# Altium footprint library LHAC-4XDSP2XV7-VP5_0226_3.PcbLib: 96 footprints (part 8 of 12)
Each footprint in its own frame and in the unit in brackets; x right, y up, seen from the top. Pads: shape width x height; smd on the part's side, far side on the other; paste and mask are expansions set on the pad; w line width, h text height; cw(c..) or ccw(c..) is an arc to the next point about the centre after c.
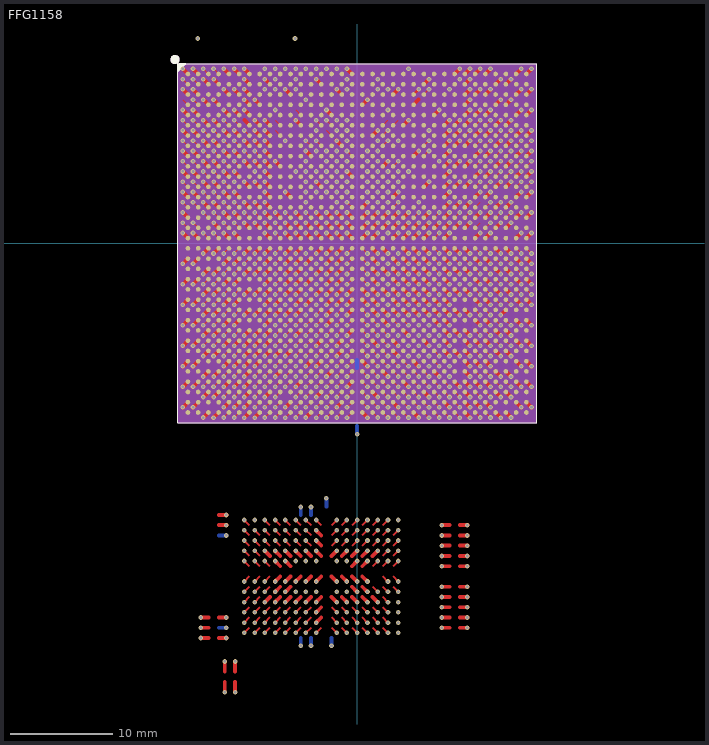
[diagram p7: the footprint, top view; thin cyan lines are the x and y axes]

## FFG1158 [mil] "FFG1158"
pads (1156):
  round 17.72 smd: A1(-649.6,649.6) A2(-610.2,649.6) A3(-570.9,649.6) A4(-531.5,649.6) A5(-492.1,649.6) A6(-452.8,649.6) A7(-413.4,649.6) A8(-374,649.6) A9(-334.6,649.6) A10(-295.3,649.6) A11(-255.9,649.6) A12(-216.5,649.6) A13(-177.2,649.6) A14(-137.8,649.6) A15(-98.4,649.6) A16(-59.1,649.6) A17(-19.7,649.6) A18(19.7,649.6) A19(59.1,649.6) A20(98.4,649.6) A21(137.8,649.6) A22(177.2,649.6) A23(216.5,649.6) A24(255.9,649.6) A25(295.3,649.6) A26(334.6,649.6) A27(374,649.6) A28(413.4,649.6) A29(452.8,649.6) A30(492.1,649.6) A31(531.5,649.6) A32(570.9,649.6) A33(610.2,649.6) A34(649.6,649.6) AA1(-649.6,-137.8) AA2(-610.2,-137.8) AA3(-570.9,-137.8) AA4(-531.5,-137.8) AA5(-492.1,-137.8) AA6(-452.8,-137.8) AA7(-413.4,-137.8) AA8(-374,-137.8) AA9(-334.6,-137.8) AA10(-295.3,-137.8) AA11(-255.9,-137.8) AA12(-216.5,-137.8) AA13(-177.2,-137.8) AA14(-137.8,-137.8) AA15(-98.4,-137.8) AA16(-59.1,-137.8) AA17(-19.7,-137.8) AA18(19.7,-137.8) AA19(59.1,-137.8) AA20(98.4,-137.8) AA21(137.8,-137.8) AA22(177.2,-137.8) AA23(216.5,-137.8) AA24(255.9,-137.8) AA25(295.3,-137.8) AA26(334.6,-137.8) AA27(374,-137.8) AA28(413.4,-137.8) AA29(452.8,-137.8) AA30(492.1,-137.8) AA31(531.5,-137.8) AA32(570.9,-137.8) AA33(610.2,-137.8) AA34(649.6,-137.8) AB1(-649.6,-177.2) AB2(-610.2,-177.2) AB3(-570.9,-177.2) AB4(-531.5,-177.2) AB5(-492.1,-177.2) AB6(-452.8,-177.2) AB7(-413.4,-177.2) AB8(-374,-177.2) AB9(-334.6,-177.2) AB10(-295.3,-177.2) AB11(-255.9,-177.2) AB12(-216.5,-177.2) AB13(-177.2,-177.2) AB14(-137.8,-177.2) AB15(-98.4,-177.2) AB16(-59.1,-177.2) AB17(-19.7,-177.2) AB18(19.7,-177.2) AB19(59.1,-177.2) AB20(98.4,-177.2) AB21(137.8,-177.2) AB22(177.2,-177.2) AB23(216.5,-177.2) AB24(255.9,-177.2) AB25(295.3,-177.2) AB26(334.6,-177.2) AB27(374,-177.2) AB28(413.4,-177.2) AB29(452.8,-177.2) AB30(492.1,-177.2) AB31(531.5,-177.2) AB32(570.9,-177.2) AB33(610.2,-177.2) AB34(649.6,-177.2) AC1(-649.6,-216.5) AC2(-610.2,-216.5) AC3(-570.9,-216.5) AC4(-531.5,-216.5) AC5(-492.1,-216.5) AC6(-452.8,-216.5) AC7(-413.4,-216.5) AC8(-374,-216.5) AC9(-334.6,-216.5) AC10(-295.3,-216.5) AC11(-255.9,-216.5) AC12(-216.5,-216.5) AC13(-177.2,-216.5) AC14(-137.8,-216.5) AC15(-98.4,-216.5) AC16(-59.1,-216.5) AC17(-19.7,-216.5) AC18(19.7,-216.5) AC19(59.1,-216.5) AC20(98.4,-216.5) AC21(137.8,-216.5) AC22(177.2,-216.5) AC23(216.5,-216.5) AC24(255.9,-216.5) AC25(295.3,-216.5) AC26(334.6,-216.5) AC27(374,-216.5) AC28(413.4,-216.5) AC29(452.8,-216.5) AC30(492.1,-216.5) AC31(531.5,-216.5) AC32(570.9,-216.5) AC33(610.2,-216.5) AC34(649.6,-216.5) AD1(-649.6,-255.9) AD2(-610.2,-255.9) AD3(-570.9,-255.9) AD4(-531.5,-255.9) AD5(-492.1,-255.9) AD6(-452.8,-255.9) AD7(-413.4,-255.9) AD8(-374,-255.9) AD9(-334.6,-255.9) AD10(-295.3,-255.9) AD11(-255.9,-255.9) AD12(-216.5,-255.9) AD13(-177.2,-255.9) AD14(-137.8,-255.9) AD15(-98.4,-255.9) AD16(-59.1,-255.9) AD17(-19.7,-255.9) AD18(19.7,-255.9) AD19(59.1,-255.9) AD20(98.4,-255.9) AD21(137.8,-255.9) AD22(177.2,-255.9) AD23(216.5,-255.9) AD24(255.9,-255.9) AD25(295.3,-255.9) AD26(334.6,-255.9) AD27(374,-255.9) AD28(413.4,-255.9) AD29(452.8,-255.9) AD30(492.1,-255.9) AD31(531.5,-255.9) AD32(570.9,-255.9) AD33(610.2,-255.9) AD34(649.6,-255.9) AE1(-649.6,-295.3) AE2(-610.2,-295.3) AE3(-570.9,-295.3) AE4(-531.5,-295.3) AE5(-492.1,-295.3) AE6(-452.8,-295.3) AE7(-413.4,-295.3) AE8(-374,-295.3) AE9(-334.6,-295.3) AE10(-295.3,-295.3) AE11(-255.9,-295.3) AE12(-216.5,-295.3) AE13(-177.2,-295.3) AE14(-137.8,-295.3) AE15(-98.4,-295.3) AE16(-59.1,-295.3) AE17(-19.7,-295.3) AE18(19.7,-295.3) AE19(59.1,-295.3) AE20(98.4,-295.3) AE21(137.8,-295.3) AE22(177.2,-295.3) AE23(216.5,-295.3) AE24(255.9,-295.3) AE25(295.3,-295.3) AE26(334.6,-295.3) AE27(374,-295.3) AE28(413.4,-295.3) AE29(452.8,-295.3) AE30(492.1,-295.3) AE31(531.5,-295.3) AE32(570.9,-295.3) AE33(610.2,-295.3) AE34(649.6,-295.3) AF1(-649.6,-334.6) AF2(-610.2,-334.6) AF3(-570.9,-334.6) AF4(-531.5,-334.6) AF5(-492.1,-334.6) AF6(-452.8,-334.6) AF7(-413.4,-334.6) AF8(-374,-334.6) AF9(-334.6,-334.6) AF10(-295.3,-334.6) AF11(-255.9,-334.6) AF12(-216.5,-334.6) AF13(-177.2,-334.6) AF14(-137.8,-334.6) AF15(-98.4,-334.6) AF16(-59.1,-334.6) AF17(-19.7,-334.6) AF18(19.7,-334.6) AF19(59.1,-334.6) AF20(98.4,-334.6) AF21(137.8,-334.6) AF22(177.2,-334.6) AF23(216.5,-334.6) AF24(255.9,-334.6) AF25(295.3,-334.6) AF26(334.6,-334.6) AF27(374,-334.6) AF28(413.4,-334.6) AF29(452.8,-334.6) AF30(492.1,-334.6) AF31(531.5,-334.6) AF32(570.9,-334.6) AF33(610.2,-334.6) AF34(649.6,-334.6) AG1(-649.6,-374) AG2(-610.2,-374) AG3(-570.9,-374) AG4(-531.5,-374) AG5(-492.1,-374) AG6(-452.8,-374) AG7(-413.4,-374) AG8(-374,-374) AG9(-334.6,-374) AG10(-295.3,-374) AG11(-255.9,-374) AG12(-216.5,-374) AG13(-177.2,-374) AG14(-137.8,-374) AG15(-98.4,-374) AG16(-59.1,-374) AG17(-19.7,-374) AG18(19.7,-374) AG19(59.1,-374) AG20(98.4,-374) AG21(137.8,-374) AG22(177.2,-374) AG23(216.5,-374) AG24(255.9,-374) AG25(295.3,-374) AG26(334.6,-374) AG27(374,-374) AG28(413.4,-374) AG29(452.8,-374) AG30(492.1,-374) AG31(531.5,-374) AG32(570.9,-374) AG33(610.2,-374) AG34(649.6,-374) AH1(-649.6,-413.4) AH2(-610.2,-413.4) AH3(-570.9,-413.4) AH4(-531.5,-413.4) AH5(-492.1,-413.4) AH6(-452.8,-413.4) AH7(-413.4,-413.4) AH8(-374,-413.4) AH9(-334.6,-413.4) AH10(-295.3,-413.4) AH11(-255.9,-413.4) AH12(-216.5,-413.4) AH13(-177.2,-413.4) AH14(-137.8,-413.4) AH15(-98.4,-413.4) AH16(-59.1,-413.4) AH17(-19.7,-413.4) AH18(19.7,-413.4) AH19(59.1,-413.4) AH20(98.4,-413.4) AH21(137.8,-413.4) AH22(177.2,-413.4) AH23(216.5,-413.4) AH24(255.9,-413.4) AH25(295.3,-413.4) AH26(334.6,-413.4) AH27(374,-413.4) AH28(413.4,-413.4) AH29(452.8,-413.4) AH30(492.1,-413.4) AH31(531.5,-413.4) AH32(570.9,-413.4) AH33(610.2,-413.4) AH34(649.6,-413.4) AJ1(-649.6,-452.8) AJ2(-610.2,-452.8) AJ3(-570.9,-452.8) AJ4(-531.5,-452.8) AJ5(-492.1,-452.8) AJ6(-452.8,-452.8) AJ7(-413.4,-452.8) AJ8(-374,-452.8) AJ9(-334.6,-452.8) AJ10(-295.3,-452.8) AJ11(-255.9,-452.8) AJ12(-216.5,-452.8) AJ13(-177.2,-452.8) AJ14(-137.8,-452.8) AJ15(-98.4,-452.8) AJ16(-59.1,-452.8) AJ17(-19.7,-452.8) AJ18(19.7,-452.8) AJ19(59.1,-452.8) AJ20(98.4,-452.8) AJ21(137.8,-452.8) AJ22(177.2,-452.8) AJ23(216.5,-452.8) AJ24(255.9,-452.8) AJ25(295.3,-452.8) AJ26(334.6,-452.8) AJ27(374,-452.8) AJ28(413.4,-452.8) AJ29(452.8,-452.8) AJ30(492.1,-452.8) AJ31(531.5,-452.8) AJ32(570.9,-452.8) AJ33(610.2,-452.8) AJ34(649.6,-452.8) AK1(-649.6,-492.1) AK2(-610.2,-492.1) AK3(-570.9,-492.1) AK4(-531.5,-492.1) AK5(-492.1,-492.1) AK6(-452.8,-492.1) AK7(-413.4,-492.1) AK8(-374,-492.1) AK9(-334.6,-492.1) AK10(-295.3,-492.1) AK11(-255.9,-492.1) AK12(-216.5,-492.1) AK13(-177.2,-492.1) AK14(-137.8,-492.1) AK15(-98.4,-492.1) AK16(-59.1,-492.1) AK17(-19.7,-492.1) AK18(19.7,-492.1) AK19(59.1,-492.1) AK20(98.4,-492.1) AK21(137.8,-492.1) AK22(177.2,-492.1) AK23(216.5,-492.1) AK24(255.9,-492.1) AK25(295.3,-492.1) AK26(334.6,-492.1) AK27(374,-492.1) AK28(413.4,-492.1) AK29(452.8,-492.1) AK30(492.1,-492.1) AK31(531.5,-492.1) AK32(570.9,-492.1) AK33(610.2,-492.1) AK34(649.6,-492.1) AL1(-649.6,-531.5) AL2(-610.2,-531.5) AL3(-570.9,-531.5) AL4(-531.5,-531.5) AL5(-492.1,-531.5) AL6(-452.8,-531.5) AL7(-413.4,-531.5) AL8(-374,-531.5) AL9(-334.6,-531.5) AL10(-295.3,-531.5) AL11(-255.9,-531.5) AL12(-216.5,-531.5) AL13(-177.2,-531.5) AL14(-137.8,-531.5) AL15(-98.4,-531.5) AL16(-59.1,-531.5) AL17(-19.7,-531.5) AL18(19.7,-531.5) AL19(59.1,-531.5) AL20(98.4,-531.5) AL21(137.8,-531.5) AL22(177.2,-531.5) AL23(216.5,-531.5) AL24(255.9,-531.5) AL25(295.3,-531.5) AL26(334.6,-531.5) AL27(374,-531.5) AL28(413.4,-531.5) AL29(452.8,-531.5) AL30(492.1,-531.5) AL31(531.5,-531.5) AL32(570.9,-531.5) AL33(610.2,-531.5) AL34(649.6,-531.5) AM1(-649.6,-570.9) AM2(-610.2,-570.9) AM3(-570.9,-570.9) AM4(-531.5,-570.9) AM5(-492.1,-570.9) AM6(-452.8,-570.9) AM7(-413.4,-570.9) AM8(-374,-570.9) AM9(-334.6,-570.9) AM10(-295.3,-570.9) AM11(-255.9,-570.9) AM12(-216.5,-570.9) AM13(-177.2,-570.9) AM14(-137.8,-570.9) AM15(-98.4,-570.9) AM16(-59.1,-570.9) AM17(-19.7,-570.9) AM18(19.7,-570.9) AM19(59.1,-570.9) AM20(98.4,-570.9) AM21(137.8,-570.9) AM22(177.2,-570.9) AM23(216.5,-570.9) AM24(255.9,-570.9) AM25(295.3,-570.9) AM26(334.6,-570.9) AM27(374,-570.9) AM28(413.4,-570.9) AM29(452.8,-570.9) AM30(492.1,-570.9) AM31(531.5,-570.9) AM32(570.9,-570.9) AM33(610.2,-570.9) AM34(649.6,-570.9) AN1(-649.6,-610.2) AN2(-610.2,-610.2) AN3(-570.9,-610.2) AN4(-531.5,-610.2) AN5(-492.1,-610.2) AN6(-452.8,-610.2) AN7(-413.4,-610.2) AN8(-374,-610.2) AN9(-334.6,-610.2) AN10(-295.3,-610.2) AN11(-255.9,-610.2) AN12(-216.5,-610.2) AN13(-177.2,-610.2) AN14(-137.8,-610.2) AN15(-98.4,-610.2) AN16(-59.1,-610.2) AN17(-19.7,-610.2) AN18(19.7,-610.2) AN19(59.1,-610.2) AN20(98.4,-610.2) AN21(137.8,-610.2) AN22(177.2,-610.2) AN23(216.5,-610.2) AN24(255.9,-610.2) AN25(295.3,-610.2) AN26(334.6,-610.2) AN27(374,-610.2) AN28(413.4,-610.2) AN29(452.8,-610.2) AN30(492.1,-610.2) AN31(531.5,-610.2) AN32(570.9,-610.2) AN33(610.2,-610.2) AN34(649.6,-610.2) AP1(-649.6,-649.6) AP2(-610.2,-649.6) AP3(-570.9,-649.6) AP4(-531.5,-649.6) AP5(-492.1,-649.6) AP6(-452.8,-649.6) AP7(-413.4,-649.6) AP8(-374,-649.6) AP9(-334.6,-649.6) AP10(-295.3,-649.6) AP11(-255.9,-649.6) AP12(-216.5,-649.6) AP13(-177.2,-649.6) AP14(-137.8,-649.6) AP15(-98.4,-649.6) AP16(-59.1,-649.6) AP17(-19.7,-649.6) AP18(19.7,-649.6) AP19(59.1,-649.6) AP20(98.4,-649.6) AP21(137.8,-649.6) AP22(177.2,-649.6) AP23(216.5,-649.6) AP24(255.9,-649.6) AP25(295.3,-649.6) AP26(334.6,-649.6) AP27(374,-649.6) AP28(413.4,-649.6) AP29(452.8,-649.6) AP30(492.1,-649.6) AP31(531.5,-649.6) AP32(570.9,-649.6) AP33(610.2,-649.6) AP34(649.6,-649.6) B1(-649.6,610.2) B2(-610.2,610.2) B3(-570.9,610.2) B4(-531.5,610.2) B5(-492.1,610.2) B6(-452.8,610.2) B7(-413.4,610.2) B8(-374,610.2) B9(-334.6,610.2) B10(-295.3,610.2) B11(-255.9,610.2) B12(-216.5,610.2) B13(-177.2,610.2) B14(-137.8,610.2) B15(-98.4,610.2) B16(-59.1,610.2) B17(-19.7,610.2) B18(19.7,610.2) B19(59.1,610.2) B20(98.4,610.2) B21(137.8,610.2) B22(177.2,610.2) B23(216.5,610.2) B24(255.9,610.2) B25(295.3,610.2) B26(334.6,610.2) B27(374,610.2) B28(413.4,610.2) B29(452.8,610.2) B30(492.1,610.2) B31(531.5,610.2) B32(570.9,610.2) B33(610.2,610.2) B34(649.6,610.2) C1(-649.6,570.9) C2(-610.2,570.9) C3(-570.9,570.9) C4(-531.5,570.9) C5(-492.1,570.9) C6(-452.8,570.9) C7(-413.4,570.9) C8(-374,570.9) C9(-334.6,570.9) C10(-295.3,570.9) C11(-255.9,570.9) C12(-216.5,570.9) C13(-177.2,570.9) C14(-137.8,570.9) C15(-98.4,570.9) C16(-59.1,570.9) C17(-19.7,570.9) C18(19.7,570.9) C19(59.1,570.9) C20(98.4,570.9) C21(137.8,570.9) C22(177.2,570.9) C23(216.5,570.9) C24(255.9,570.9) C25(295.3,570.9) C26(334.6,570.9) C27(374,570.9) C28(413.4,570.9) C29(452.8,570.9) C30(492.1,570.9) C31(531.5,570.9) C32(570.9,570.9) C33(610.2,570.9) C34(649.6,570.9) D1(-649.6,531.5) D2(-610.2,531.5) D3(-570.9,531.5) D4(-531.5,531.5) D5(-492.1,531.5) D6(-452.8,531.5) D7(-413.4,531.5) D8(-374,531.5) D9(-334.6,531.5) D10(-295.3,531.5) D11(-255.9,531.5) D12(-216.5,531.5) D13(-177.2,531.5) D14(-137.8,531.5) D15(-98.4,531.5) D16(-59.1,531.5) D17(-19.7,531.5) D18(19.7,531.5) D19(59.1,531.5) D20(98.4,531.5) D21(137.8,531.5) D22(177.2,531.5) D23(216.5,531.5) D24(255.9,531.5) D25(295.3,531.5) D26(334.6,531.5) D27(374,531.5) D28(413.4,531.5) D29(452.8,531.5) D30(492.1,531.5) D31(531.5,531.5) D32(570.9,531.5) D33(610.2,531.5) D34(649.6,531.5) E1(-649.6,492.1) E2(-610.2,492.1) E3(-570.9,492.1) E4(-531.5,492.1) E5(-492.1,492.1) E6(-452.8,492.1) E7(-413.4,492.1) E8(-374,492.1) E9(-334.6,492.1) E10(-295.3,492.1) E11(-255.9,492.1) E12(-216.5,492.1) E13(-177.2,492.1) E14(-137.8,492.1) E15(-98.4,492.1) E16(-59.1,492.1) E17(-19.7,492.1) E18(19.7,492.1) E19(59.1,492.1) E20(98.4,492.1) E21(137.8,492.1) E22(177.2,492.1) E23(216.5,492.1) E24(255.9,492.1) E25(295.3,492.1) E26(334.6,492.1) E27(374,492.1) E28(413.4,492.1) E29(452.8,492.1) E30(492.1,492.1) E31(531.5,492.1) E32(570.9,492.1) E33(610.2,492.1) E34(649.6,492.1) F1(-649.6,452.8) F2(-610.2,452.8) F3(-570.9,452.8) F4(-531.5,452.8) F5(-492.1,452.8) F6(-452.8,452.8) F7(-413.4,452.8) F8(-374,452.8) F9(-334.6,452.8) F10(-295.3,452.8) F11(-255.9,452.8) F12(-216.5,452.8) F13(-177.2,452.8) F14(-137.8,452.8) F15(-98.4,452.8) F16(-59.1,452.8) F17(-19.7,452.8) F18(19.7,452.8) F19(59.1,452.8) F20(98.4,452.8) F21(137.8,452.8) F22(177.2,452.8) F23(216.5,452.8) F24(255.9,452.8) F25(295.3,452.8) F26(334.6,452.8) F27(374,452.8) F28(413.4,452.8) F29(452.8,452.8) F30(492.1,452.8) F31(531.5,452.8) F32(570.9,452.8) F33(610.2,452.8) F34(649.6,452.8) G1(-649.6,413.4) G2(-610.2,413.4) G3(-570.9,413.4) G4(-531.5,413.4) G5(-492.1,413.4) G6(-452.8,413.4) G7(-413.4,413.4) G8(-374,413.4) G9(-334.6,413.4) G10(-295.3,413.4) G11(-255.9,413.4) G12(-216.5,413.4) G13(-177.2,413.4) G14(-137.8,413.4) G15(-98.4,413.4) G16(-59.1,413.4) G17(-19.7,413.4) G18(19.7,413.4) G19(59.1,413.4) G20(98.4,413.4) G21(137.8,413.4) G22(177.2,413.4) G23(216.5,413.4) G24(255.9,413.4) G25(295.3,413.4) G26(334.6,413.4) G27(374,413.4) G28(413.4,413.4) G29(452.8,413.4) G30(492.1,413.4) G31(531.5,413.4) G32(570.9,413.4) G33(610.2,413.4) G34(649.6,413.4) H1(-649.6,374) H2(-610.2,374) H3(-570.9,374) H4(-531.5,374) H5(-492.1,374) H6(-452.8,374) H7(-413.4,374) H8(-374,374) H9(-334.6,374) H10(-295.3,374) H11(-255.9,374) H12(-216.5,374) H13(-177.2,374) H14(-137.8,374) H15(-98.4,374) H16(-59.1,374) H17(-19.7,374) H18(19.7,374) H19(59.1,374) H20(98.4,374) H21(137.8,374) H22(177.2,374) H23(216.5,374) H24(255.9,374) H25(295.3,374) H26(334.6,374) H27(374,374) H28(413.4,374) H29(452.8,374) H30(492.1,374) H31(531.5,374) H32(570.9,374) H33(610.2,374) H34(649.6,374) J1(-649.6,334.6) J2(-610.2,334.6) J3(-570.9,334.6) J4(-531.5,334.6) J5(-492.1,334.6) J6(-452.8,334.6) J7(-413.4,334.6) J8(-374,334.6) J9(-334.6,334.6) J10(-295.3,334.6) J11(-255.9,334.6) J12(-216.5,334.6) J13(-177.2,334.6) J14(-137.8,334.6) J15(-98.4,334.6) J16(-59.1,334.6) J17(-19.7,334.6) J18(19.7,334.6) J19(59.1,334.6) J20(98.4,334.6) J21(137.8,334.6) J22(177.2,334.6) J23(216.5,334.6) J24(255.9,334.6) J25(295.3,334.6) J26(334.6,334.6) J27(374,334.6) J28(413.4,334.6) J29(452.8,334.6) J30(492.1,334.6) J31(531.5,334.6) J32(570.9,334.6) J33(610.2,334.6) J34(649.6,334.6) K1(-649.6,295.3) K2(-610.2,295.3) K3(-570.9,295.3) K4(-531.5,295.3) K5(-492.1,295.3) K6(-452.8,295.3) K7(-413.4,295.3) K8(-374,295.3) K9(-334.6,295.3) K10(-295.3,295.3) K11(-255.9,295.3) K12(-216.5,295.3) K13(-177.2,295.3) K14(-137.8,295.3) K15(-98.4,295.3) K16(-59.1,295.3) K17(-19.7,295.3) K18(19.7,295.3) K19(59.1,295.3) K20(98.4,295.3) K21(137.8,295.3) K22(177.2,295.3) K23(216.5,295.3) K24(255.9,295.3) K25(295.3,295.3) K26(334.6,295.3) K27(374,295.3) K28(413.4,295.3) K29(452.8,295.3) K30(492.1,295.3) K31(531.5,295.3) K32(570.9,295.3) K33(610.2,295.3) K34(649.6,295.3) L1(-649.6,255.9) L2(-610.2,255.9) L3(-570.9,255.9) L4(-531.5,255.9) L5(-492.1,255.9) L6(-452.8,255.9) L7(-413.4,255.9) L8(-374,255.9) L9(-334.6,255.9) L10(-295.3,255.9) L11(-255.9,255.9) L12(-216.5,255.9) L13(-177.2,255.9) L14(-137.8,255.9) L15(-98.4,255.9) L16(-59.1,255.9) L17(-19.7,255.9) L18(19.7,255.9) L19(59.1,255.9) L20(98.4,255.9) L21(137.8,255.9) L22(177.2,255.9) L23(216.5,255.9) L24(255.9,255.9) L25(295.3,255.9) L26(334.6,255.9) L27(374,255.9) L28(413.4,255.9) L29(452.8,255.9) L30(492.1,255.9) L31(531.5,255.9) L32(570.9,255.9) L33(610.2,255.9) L34(649.6,255.9) M1(-649.6,216.5) M2(-610.2,216.5) M3(-570.9,216.5) M4(-531.5,216.5) M5(-492.1,216.5) M6(-452.8,216.5) M7(-413.4,216.5) M8(-374,216.5) M9(-334.6,216.5) M10(-295.3,216.5) M11(-255.9,216.5) M12(-216.5,216.5) M13(-177.2,216.5) M14(-137.8,216.5) M15(-98.4,216.5) M16(-59.1,216.5) M17(-19.7,216.5) M18(19.7,216.5) M19(59.1,216.5) M20(98.4,216.5) M21(137.8,216.5) M22(177.2,216.5) M23(216.5,216.5) M24(255.9,216.5) M25(295.3,216.5) M26(334.6,216.5) M27(374,216.5) M28(413.4,216.5) M29(452.8,216.5) M30(492.1,216.5) M31(531.5,216.5) M32(570.9,216.5) M33(610.2,216.5) M34(649.6,216.5) N1(-649.6,177.2) N2(-610.2,177.2) N3(-570.9,177.2) N4(-531.5,177.2) N5(-492.1,177.2) N6(-452.8,177.2) N7(-413.4,177.2) N8(-374,177.2) N9(-334.6,177.2) N10(-295.3,177.2) N11(-255.9,177.2) N12(-216.5,177.2) N13(-177.2,177.2) N14(-137.8,177.2) N15(-98.4,177.2) N16(-59.1,177.2) N17(-19.7,177.2) N18(19.7,177.2) N19(59.1,177.2) N20(98.4,177.2) N21(137.8,177.2) N22(177.2,177.2) N23(216.5,177.2) N24(255.9,177.2) N25(295.3,177.2) N26(334.6,177.2) N27(374,177.2) N28(413.4,177.2) N29(452.8,177.2) N30(492.1,177.2) N31(531.5,177.2) N32(570.9,177.2) N33(610.2,177.2) N34(649.6,177.2) P1(-649.6,137.8) P2(-610.2,137.8) P3(-570.9,137.8) P4(-531.5,137.8) P5(-492.1,137.8) P6(-452.8,137.8) P7(-413.4,137.8) P8(-374,137.8) P9(-334.6,137.8) P10(-295.3,137.8) P11(-255.9,137.8) P12(-216.5,137.8) P13(-177.2,137.8) P14(-137.8,137.8) P15(-98.4,137.8) P16(-59.1,137.8) P17(-19.7,137.8) P18(19.7,137.8) P19(59.1,137.8) P20(98.4,137.8) P21(137.8,137.8) P22(177.2,137.8) P23(216.5,137.8) P24(255.9,137.8) P25(295.3,137.8) P26(334.6,137.8) P27(374,137.8) P28(413.4,137.8) P29(452.8,137.8) P30(492.1,137.8) P31(531.5,137.8) P32(570.9,137.8) P33(610.2,137.8) P34(649.6,137.8) R1(-649.6,98.4) R2(-610.2,98.4) R3(-570.9,98.4) R4(-531.5,98.4) R5(-492.1,98.4) R6(-452.8,98.4) R7(-413.4,98.4) R8(-374,98.4) R9(-334.6,98.4) R10(-295.3,98.4) R11(-255.9,98.4) R12(-216.5,98.4) R13(-177.2,98.4) R14(-137.8,98.4) R15(-98.4,98.4) R16(-59.1,98.4) R17(-19.7,98.4) R18(19.7,98.4) R19(59.1,98.4) R20(98.4,98.4) R21(137.8,98.4) R22(177.2,98.4) R23(216.5,98.4) R24(255.9,98.4) R25(295.3,98.4) R26(334.6,98.4) R27(374,98.4) R28(413.4,98.4) R29(452.8,98.4) R30(492.1,98.4) R31(531.5,98.4) R32(570.9,98.4) R33(610.2,98.4) R34(649.6,98.4) T1(-649.6,59.1) T2(-610.2,59.1) T3(-570.9,59.1) T4(-531.5,59.1) T5(-492.1,59.1) T6(-452.8,59.1) T7(-413.4,59.1) T8(-374,59.1) T9(-334.6,59.1) T10(-295.3,59.1) T11(-255.9,59.1) T12(-216.5,59.1) T13(-177.2,59.1) T14(-137.8,59.1) T15(-98.4,59.1) T16(-59.1,59.1) T17(-19.7,59.1) T18(19.7,59.1) T19(59.1,59.1) T20(98.4,59.1) T21(137.8,59.1) T22(177.2,59.1) T23(216.5,59.1) T24(255.9,59.1) T25(295.3,59.1) T26(334.6,59.1) T27(374,59.1) T28(413.4,59.1) T29(452.8,59.1) T30(492.1,59.1) T31(531.5,59.1) T32(570.9,59.1) T33(610.2,59.1) T34(649.6,59.1) U1(-649.6,19.7) U2(-610.2,19.7) U3(-570.9,19.7) U4(-531.5,19.7) U5(-492.1,19.7) U6(-452.8,19.7) U7(-413.4,19.7) U8(-374,19.7) U9(-334.6,19.7) U10(-295.3,19.7) U11(-255.9,19.7) U12(-216.5,19.7) U13(-177.2,19.7) U14(-137.8,19.7) U15(-98.4,19.7) U16(-59.1,19.7) U17(-19.7,19.7) U18(19.7,19.7) U19(59.1,19.7) U20(98.4,19.7) U21(137.8,19.7) U22(177.2,19.7) U23(216.5,19.7) U24(255.9,19.7) U25(295.3,19.7) U26(334.6,19.7) U27(374,19.7) U28(413.4,19.7) U29(452.8,19.7) U30(492.1,19.7) U31(531.5,19.7) U32(570.9,19.7) U33(610.2,19.7) U34(649.6,19.7) V1(-649.6,-19.7) V2(-610.2,-19.7) V3(-570.9,-19.7) V4(-531.5,-19.7) V5(-492.1,-19.7) V6(-452.8,-19.7) V7(-413.4,-19.7) V8(-374,-19.7) V9(-334.6,-19.7) V10(-295.3,-19.7) V11(-255.9,-19.7) V12(-216.5,-19.7) V13(-177.2,-19.7) V14(-137.8,-19.7) V15(-98.4,-19.7) V16(-59.1,-19.7) V17(-19.7,-19.7) V18(19.7,-19.7) V19(59.1,-19.7) V20(98.4,-19.7) V21(137.8,-19.7) V22(177.2,-19.7) V23(216.5,-19.7) V24(255.9,-19.7) V25(295.3,-19.7) V26(334.6,-19.7) V27(374,-19.7) V28(413.4,-19.7) V29(452.8,-19.7) V30(492.1,-19.7) V31(531.5,-19.7) V32(570.9,-19.7) V33(610.2,-19.7) V34(649.6,-19.7) W1(-649.6,-59.1) W2(-610.2,-59.1) W3(-570.9,-59.1) W4(-531.5,-59.1) W5(-492.1,-59.1) W6(-452.8,-59.1) W7(-413.4,-59.1) W8(-374,-59.1) W9(-334.6,-59.1) W10(-295.3,-59.1) W11(-255.9,-59.1) W12(-216.5,-59.1) W13(-177.2,-59.1) W14(-137.8,-59.1) W15(-98.4,-59.1) W16(-59.1,-59.1) W17(-19.7,-59.1) W18(19.7,-59.1) W19(59.1,-59.1) W20(98.4,-59.1) W21(137.8,-59.1) W22(177.2,-59.1) W23(216.5,-59.1) W24(255.9,-59.1) W25(295.3,-59.1) W26(334.6,-59.1) W27(374,-59.1) W28(413.4,-59.1) W29(452.8,-59.1) W30(492.1,-59.1) W31(531.5,-59.1) W32(570.9,-59.1) W33(610.2,-59.1) W34(649.6,-59.1) Y1(-649.6,-98.4) Y2(-610.2,-98.4) Y3(-570.9,-98.4) Y4(-531.5,-98.4) Y5(-492.1,-98.4) Y6(-452.8,-98.4) Y7(-413.4,-98.4) Y8(-374,-98.4) Y9(-334.6,-98.4) Y10(-295.3,-98.4) Y11(-255.9,-98.4) Y12(-216.5,-98.4) Y13(-177.2,-98.4) Y14(-137.8,-98.4) Y15(-98.4,-98.4) Y16(-59.1,-98.4) Y17(-19.7,-98.4) Y18(19.7,-98.4) Y19(59.1,-98.4) Y20(98.4,-98.4) Y21(137.8,-98.4) Y22(177.2,-98.4) Y23(216.5,-98.4) Y24(255.9,-98.4) Y25(295.3,-98.4) Y26(334.6,-98.4) Y27(374,-98.4) Y28(413.4,-98.4) Y29(452.8,-98.4) Y30(492.1,-98.4) Y31(531.5,-98.4) Y32(570.9,-98.4) Y33(610.2,-98.4) Y34(649.6,-98.4)
via -354.25,629.85 diameter 18 hole 10
via -314.95,511.75 diameter 18 hole 10
via -275.6,393.7 diameter 18 hole 10
via -275.55,-236.15 diameter 18 hole 10
via -314.95,-314.95 diameter 18 hole 10
via -236.15,275.55 diameter 18 hole 10
via 196.85,275.55 diameter 18 hole 10
via -236.15,669.25 diameter 18 hole 10
via -196.85,551.15 diameter 18 hole 10
via -157.5,433.1 diameter 18 hole 10
via -78.75,590.55 diameter 18 hole 10
via 78.75,629.85 diameter 18 hole 10
via 118.05,511.75 diameter 18 hole 10
via -39.35,472.45 diameter 18 hole 10
via 39.35,354.25 diameter 18 hole 10
via -118.05,314.95 diameter 18 hole 10
via 157.5,393.7 diameter 18 hole 10
via 354.25,590.55 diameter 18 hole 10
via 196.85,669.25 diameter 18 hole 10
via 275.6,433.1 diameter 18 hole 10
via 314.95,314.95 diameter 18 hole 10
via -196.85,-118.05 diameter 18 hole 10
via -157.5,-157.5 diameter 18 hole 10
via -196.85,-39.35 diameter 18 hole 10
via -157.45,-78.75 diameter 18 hole 10
via -196.85,157.45 diameter 18 hole 10
via -196.85,-275.55 diameter 18 hole 10
via -196.85,-196.85 diameter 18 hole 10
via -157.45,-236.15 diameter 18 hole 10
via -78.75,196.85 diameter 18 hole 10
via 78.75,236.15 diameter 18 hole 10
via 118.05,39.35 diameter 18 hole 10
via 118.05,-157.45 diameter 18 hole 10
via 118.05,-78.75 diameter 18 hole 10
via 157.5,-39.4 diameter 18 hole 10
via 157.45,-118.05 diameter 18 hole 10
via 118.05,-236.15 diameter 18 hole 10
via 157.5,-275.6 diameter 18 hole 10
via 157.45,-196.85 diameter 18 hole 10
via 236.15,157.45 diameter 18 hole 10
via -236.29,-1220.02 diameter 18 hole 10
via -236.29,-1338.12 diameter 18 hole 10
via -157.55,-1220.02 diameter 18 hole 10
via -157.55,-1338.12 diameter 18 hole 10
via -196.92,-1220.02 diameter 18 hole 10
via -196.92,-1338.12 diameter 18 hole 10
via -39.45,-1338.12 diameter 18 hole 10
via -78.82,-1338.12 diameter 18 hole 10
via -39.45,-1220.02 diameter 18 hole 10
via -78.82,-1220.02 diameter 18 hole 10
via -629.85,629.85 diameter 18 hole 10
via 78.75,196.85 diameter 18 hole 10
via 39.35,196.85 diameter 18 hole 10
via -118.05,354.25 diameter 18 hole 10
via -314.95,669.25 diameter 18 hole 10
via -118.05,472.45 diameter 18 hole 10
via -157.45,472.45 diameter 18 hole 10
via -472.45,472.45 diameter 18 hole 10
via -511.75,472.45 diameter 18 hole 10
via -472.45,314.95 diameter 18 hole 10
via -590.55,354.25 diameter 18 hole 10
via -551.15,354.25 diameter 18 hole 10
via -472.45,393.65 diameter 18 hole 10
via -511.75,393.65 diameter 18 hole 10
via -511.75,314.95 diameter 18 hole 10
via 511.75,157.45 diameter 18 hole 10
via 590.55,118.05 diameter 18 hole 10
via 511.75,78.75 diameter 18 hole 10
via 551.2,275.6 diameter 18 hole 10
via 590.55,275.55 diameter 18 hole 10
via 551.15,118.05 diameter 18 hole 10
via 275.55,-472.45 diameter 18 hole 10
via 314.95,-393.65 diameter 18 hole 10
via 314.95,-354.25 diameter 18 hole 10
via 157.45,-354.25 diameter 18 hole 10
via 354.25,-511.75 diameter 18 hole 10
via 354.25,-472.45 diameter 18 hole 10
via -236.15,-472.45 diameter 18 hole 10
via -236.15,-511.75 diameter 18 hole 10
via -39.4,-157.5 diameter 18 hole 10
via 39.4,-157.5 diameter 18 hole 10
via 39.35,-78.75 diameter 18 hole 10
via -39.35,-118.05 diameter 18 hole 10
via 118.05,393.65 diameter 18 hole 10
via -275.6,-393.7 diameter 18 hole 10
via 551.2,433.1 diameter 18 hole 10
via 629.85,393.65 diameter 18 hole 10
via 629.85,314.95 diameter 18 hole 10
via 629.85,236.15 diameter 18 hole 10
via 590.55,433.05 diameter 18 hole 10
via 669.3,393.7 diameter 18 hole 10
via 669.25,314.95 diameter 18 hole 10
via 669.25,236.15 diameter 18 hole 10
via -551.2,433.1 diameter 18 hole 10
via -629.85,393.65 diameter 18 hole 10
via -629.85,314.95 diameter 18 hole 10
via -629.85,236.15 diameter 18 hole 10
via -590.55,433.05 diameter 18 hole 10
via -669.3,393.7 diameter 18 hole 10
via -669.25,314.95 diameter 18 hole 10
via -669.25,236.15 diameter 18 hole 10
via -551.15,196.85 diameter 18 hole 10
via -629.85,157.45 diameter 18 hole 10
via -629.85,78.75 diameter 18 hole 10
via -551.2,39.4 diameter 18 hole 10
via -590.55,196.85 diameter 18 hole 10
via -669.3,157.5 diameter 18 hole 10
via -669.25,78.75 diameter 18 hole 10
via -590.55,39.35 diameter 18 hole 10
via 472.45,314.95 diameter 18 hole 10
via 551.15,354.25 diameter 18 hole 10
via 472.45,393.65 diameter 18 hole 10
via 590.55,354.25 diameter 18 hole 10
via 511.75,314.95 diameter 18 hole 10
via 511.75,236.15 diameter 18 hole 10
via 472.45,472.45 diameter 18 hole 10
via 393.65,118.05 diameter 18 hole 10
via 511.75,472.45 diameter 18 hole 10
via 433.05,118.05 diameter 18 hole 10
via 472.45,236.15 diameter 18 hole 10
via 511.75,393.65 diameter 18 hole 10
via -511.75,236.15 diameter 18 hole 10
via -590.55,275.55 diameter 18 hole 10
via -472.45,78.75 diameter 18 hole 10
via -551.2,275.6 diameter 18 hole 10
via -551.15,118.05 diameter 18 hole 10
via -590.55,118.05 diameter 18 hole 10
via -472.45,236.15 diameter 18 hole 10
via -472.45,157.45 diameter 18 hole 10
via -511.75,157.45 diameter 18 hole 10
via -511.75,78.75 diameter 18 hole 10
via -393.65,118.05 diameter 18 hole 10
via -433.05,118.05 diameter 18 hole 10
via 275.55,590.55 diameter 18 hole 10
via 314.95,-196.85 diameter 18 hole 10
via 314.95,-157.45 diameter 18 hole 10
via -314.95,78.75 diameter 18 hole 10
via -314.95,-196.85 diameter 18 hole 10
via -629.85,590.55 diameter 18 hole 10
via -590.55,551.15 diameter 18 hole 10
via -590.55,236.15 diameter 18 hole 10
via -590.55,393.65 diameter 18 hole 10
via -629.85,275.55 diameter 18 hole 10
via -590.55,-118.05 diameter 18 hole 10
via -629.85,-78.75 diameter 18 hole 10
via -629.85,-236.15 diameter 18 hole 10
via -590.55,-275.55 diameter 18 hole 10
via -629.85,-393.65 diameter 18 hole 10
via -629.85,-551.15 diameter 18 hole 10
via -393.7,275.6 diameter 18 hole 10
via -393.7,433.1 diameter 18 hole 10
via -590.55,-433.05 diameter 18 hole 10
via -590.55,-590.55 diameter 18 hole 10
via -629.85,433.05 diameter 18 hole 10
via 393.7,433.1 diameter 18 hole 10
via 590.55,551.15 diameter 18 hole 10
via 629.85,275.55 diameter 18 hole 10
via 590.55,236.15 diameter 18 hole 10
via 590.55,78.75 diameter 18 hole 10
via 629.85,118.05 diameter 18 hole 10
via 629.85,433.05 diameter 18 hole 10
via 590.55,393.65 diameter 18 hole 10
via 629.85,590.55 diameter 18 hole 10
via 590.55,-118.05 diameter 18 hole 10
via 551.18,-275.55 diameter 18 hole 10
via 629.85,-236.15 diameter 18 hole 10
via 629.85,-393.65 diameter 18 hole 10
via 629.85,-78.75 diameter 18 hole 10
via 590.55,-590.55 diameter 18 hole 10
via 629.85,-551.15 diameter 18 hole 10
via 590.55,-433.05 diameter 18 hole 10
via -472.45,511.75 diameter 18 hole 10
via -472.45,590.55 diameter 18 hole 10
via -472.45,196.85 diameter 18 hole 10
via -472.45,433.05 diameter 18 hole 10
via -472.45,354.25 diameter 18 hole 10
via -472.45,275.55 diameter 18 hole 10
via -472.45,118.05 diameter 18 hole 10
via 472.45,-157.45 diameter 18 hole 10
via 472.45,-236.15 diameter 18 hole 10
via 472.45,-472.45 diameter 18 hole 10
via 472.45,-393.65 diameter 18 hole 10
via 472.45,-314.95 diameter 18 hole 10
via 472.45,-629.85 diameter 18 hole 10
via 472.45,-551.15 diameter 18 hole 10
via 472.45,590.55 diameter 18 hole 10
via 472.45,511.75 diameter 18 hole 10
via 472.45,433.05 diameter 18 hole 10
via 472.45,354.25 diameter 18 hole 10
via 472.45,275.55 diameter 18 hole 10
via 472.45,196.85 diameter 18 hole 10
via 472.45,118.05 diameter 18 hole 10
via -472.45,39.35 diameter 18 hole 10
via -472.45,-78.75 diameter 18 hole 10
via 472.45,39.35 diameter 18 hole 10
via 472.45,-78.75 diameter 18 hole 10
via -236.15,590.55 diameter 18 hole 10
via 78.75,590.55 diameter 18 hole 10
via -472.45,-157.45 diameter 18 hole 10
via -472.45,-314.95 diameter 18 hole 10
via -472.45,-393.65 diameter 18 hole 10
via -472.45,-472.45 diameter 18 hole 10
via -472.45,-236.15 diameter 18 hole 10
via -472.45,-629.85 diameter 18 hole 10
via -472.45,-551.15 diameter 18 hole 10
via -196.92,-1101.91 diameter 18 hole 10
via -196.85,-551.15 diameter 18 hole 10
via -315.03,-1101.91 diameter 18 hole 10
via -236.15,-629.85 diameter 18 hole 10
via 157.4,-1141.28 diameter 18 hole 10
via 314.95,-629.85 diameter 18 hole 10
via -354.4,-1101.91 diameter 18 hole 10
via -118.05,-393.65 diameter 18 hole 10
via -39.4,157.5 diameter 18 hole 10
via -157.55,-1062.54 diameter 18 hole 10
via 393.7,-669.3 diameter 18 hole 10
via -78.82,-1495.6 diameter 18 hole 10
via 118.05,-393.65 diameter 18 hole 10
via 39.4,-275.6 diameter 18 hole 10
via -314.95,-39.35 diameter 18 hole 10
via 157.45,-314.95 diameter 18 hole 10
via 236.15,590.55 diameter 18 hole 10
via -236.29,-1416.86 diameter 18 hole 10
via -314.95,-669.25 diameter 18 hole 10
via -196.85,118.05 diameter 18 hole 10
via 157.4,-1416.86 diameter 18 hole 10
via 354.25,-590.55 diameter 18 hole 10
via 314.95,39.35 diameter 18 hole 10
via 314.95,118.05 diameter 18 hole 10
via -433.14,-1338.12 diameter 18 hole 10
via 236.15,-590.55 diameter 18 hole 10
via -39.35,-78.75 diameter 18 hole 10
via -433.14,-1298.75 diameter 18 hole 10
via 78.75,-629.85 diameter 18 hole 10
via 236.15,118.05 diameter 18 hole 10
via -314.95,-157.45 diameter 18 hole 10
via 157.4,-1298.75 diameter 18 hole 10
via 78.75,-354.25 diameter 18 hole 10
via -314.95,39.35 diameter 18 hole 10
via 39.29,-1416.86 diameter 18 hole 10
via -393.65,-629.85 diameter 18 hole 10
via 314.95,-118.05 diameter 18 hole 10
via -275.66,-1062.54 diameter 18 hole 10
via -196.85,-629.85 diameter 18 hole 10
via 314.95,-78.75 diameter 18 hole 10
via -393.77,-1062.54 diameter 18 hole 10
via -236.15,-590.55 diameter 18 hole 10
via -433.05,354.25 diameter 18 hole 10
via -551.2,-157.5 diameter 18 hole 10
via -511.75,-39.35 diameter 18 hole 10
via -393.77,-1456.23 diameter 18 hole 10
via -39.35,-314.95 diameter 18 hole 10
via -511.75,-196.85 diameter 18 hole 10
via -472.45,-590.55 diameter 18 hole 10
via -551.2,-551.2 diameter 18 hole 10
via -275.66,-1495.6 diameter 18 hole 10
via -314.95,-354.25 diameter 18 hole 10
via -393.65,-78.75 diameter 18 hole 10
via 39.29,-1101.91 diameter 18 hole 10
via 78.75,-472.45 diameter 18 hole 10
via -511.75,-275.55 diameter 18 hole 10
via 157.4,-1456.23 diameter 18 hole 10
via 354.25,-551.15 diameter 18 hole 10
via -551.2,-393.7 diameter 18 hole 10
via -472.45,-196.85 diameter 18 hole 10
via 78.66,-1416.86 diameter 18 hole 10
via 118.05,-590.55 diameter 18 hole 10
via -472.45,-39.35 diameter 18 hole 10
via -433.14,-1220.02 diameter 18 hole 10
via 157.45,-472.45 diameter 18 hole 10
via -433.05,-78.75 diameter 18 hole 10
via -511.75,-590.55 diameter 18 hole 10
via -472.45,-118.05 diameter 18 hole 10
via -590.55,-236.15 diameter 18 hole 10
via -354.4,-1456.23 diameter 18 hole 10
via 39.35,-590.55 diameter 18 hole 10
via -275.66,-1456.23 diameter 18 hole 10
via -314.95,-590.55 diameter 18 hole 10
via -472.45,-275.55 diameter 18 hole 10
via -590.55,-314.95 diameter 18 hole 10
via -393.77,-1220.02 diameter 18 hole 10
via 157.45,-590.55 diameter 18 hole 10
via -511.75,-669.25 diameter 18 hole 10
via -511.75,-118.05 diameter 18 hole 10
via -196.92,-1456.23 diameter 18 hole 10
via -393.7,-551.2 diameter 18 hole 10
via -393.65,354.25 diameter 18 hole 10
via -196.92,-1062.54 diameter 18 hole 10
via -78.75,-669.25 diameter 18 hole 10
via -590.55,-393.65 diameter 18 hole 10
via -78.82,-1101.91 diameter 18 hole 10
via -39.4,-433.1 diameter 18 hole 10
via -551.15,-236.15 diameter 18 hole 10
via -511.75,-511.75 diameter 18 hole 10
via 78.66,-1456.23 diameter 18 hole 10
via -354.25,-551.15 diameter 18 hole 10
via -472.45,-511.75 diameter 18 hole 10
via 118.03,-1101.91 diameter 18 hole 10
via -196.85,-354.25 diameter 18 hole 10
via -39.45,-1456.23 diameter 18 hole 10
via -354.25,-669.25 diameter 18 hole 10
via -354.4,-1416.86 diameter 18 hole 10
via -236.15,-669.25 diameter 18 hole 10
via -590.55,-551.15 diameter 18 hole 10
via -236.29,-1141.28 diameter 18 hole 10
via -196.85,-433.05 diameter 18 hole 10
via -551.15,-314.95 diameter 18 hole 10
via -590.55,-157.45 diameter 18 hole 10
via -433.1,433.1 diameter 18 hole 10
via -511.75,-433.05 diameter 18 hole 10
via 118.03,-1141.28 diameter 18 hole 10
via -39.35,-472.45 diameter 18 hole 10
via -472.45,-433.05 diameter 18 hole 10
via 39.29,-1141.28 diameter 18 hole 10
via -157.45,-314.95 diameter 18 hole 10
via -511.75,-354.25 diameter 18 hole 10
via -157.55,-1495.6 diameter 18 hole 10
via -472.45,-354.25 diameter 18 hole 10
via 78.66,-1141.28 diameter 18 hole 10
via -39.35,-511.75 diameter 18 hole 10
via -472.45,-669.25 diameter 18 hole 10
via 118.03,-1495.6 diameter 18 hole 10
via -314.95,-472.45 diameter 18 hole 10
via -433.14,-1377.49 diameter 18 hole 10
via 275.6,-551.2 diameter 18 hole 10
via -433.14,-1141.28 diameter 18 hole 10
via 157.45,-511.75 diameter 18 hole 10
via -315.03,-1416.86 diameter 18 hole 10
via -39.35,-590.55 diameter 18 hole 10
via 78.66,-1062.54 diameter 18 hole 10
via 39.35,-629.85 diameter 18 hole 10
via -236.15,-314.95 diameter 18 hole 10
via 157.4,-1495.6 diameter 18 hole 10
via -314.95,-551.15 diameter 18 hole 10
via 118.03,-1338.12 diameter 18 hole 10
via 118.05,-433.05 diameter 18 hole 10
via 275.55,-354.25 diameter 18 hole 10
via 118.03,-1220.02 diameter 18 hole 10
via -118.05,-551.15 diameter 18 hole 10
via -275.66,-1416.86 diameter 18 hole 10
via 78.75,-669.25 diameter 18 hole 10
via 39.35,-511.75 diameter 18 hole 10
via -315.03,-1062.54 diameter 18 hole 10
via -118.05,-669.25 diameter 18 hole 10
via 551.2,-393.7 diameter 18 hole 10
via 590.55,-551.15 diameter 18 hole 10
via -78.75,-511.75 diameter 18 hole 10
via 472.45,-39.35 diameter 18 hole 10
via 590.55,-314.95 diameter 18 hole 10
via 511.75,-118.05 diameter 18 hole 10
via 551.2,-157.5 diameter 18 hole 10
via 511.75,-590.55 diameter 18 hole 10
via 590.55,-393.65 diameter 18 hole 10
via 551.15,-314.95 diameter 18 hole 10
via 590.55,-157.45 diameter 18 hole 10
via -196.92,-1495.6 diameter 18 hole 10
via 39.4,-393.7 diameter 18 hole 10
via 433.05,-78.75 diameter 18 hole 10
via 118.03,-1180.65 diameter 18 hole 10
via 314.95,-669.25 diameter 18 hole 10
via -393.77,-1377.49 diameter 18 hole 10
via 236.15,-629.85 diameter 18 hole 10
via -433.14,-1495.6 diameter 18 hole 10
via 472.45,-433.05 diameter 18 hole 10
via -0.08,-1062.54 diameter 18 hole 10
via -196.85,-511.75 diameter 18 hole 10
via -196.92,-1141.28 diameter 18 hole 10
via -118.05,-433.05 diameter 18 hole 10
via 511.75,-354.25 diameter 18 hole 10
via -354.4,-1220.02 diameter 18 hole 10
via 196.85,-590.55 diameter 18 hole 10
via -39.45,-1416.86 diameter 18 hole 10
via 118.05,-669.25 diameter 18 hole 10
via 511.75,-433.05 diameter 18 hole 10
via -354.4,-1495.6 diameter 18 hole 10
via -78.75,-314.95 diameter 18 hole 10
via 472.45,-669.25 diameter 18 hole 10
via 511.75,-511.75 diameter 18 hole 10
via -78.75,-275.55 diameter 18 hole 10
via 118.03,-1456.23 diameter 18 hole 10
via -393.65,-590.55 diameter 18 hole 10
via -315.03,-1495.6 diameter 18 hole 10
via -78.75,-354.25 diameter 18 hole 10
via 472.45,-590.55 diameter 18 hole 10
via -433.14,-1416.86 diameter 18 hole 10
via 275.55,-629.85 diameter 18 hole 10
via -393.77,-1141.28 diameter 18 hole 10
via -275.55,-511.75 diameter 18 hole 10
via 472.45,-118.05 diameter 18 hole 10
via -236.29,-1101.91 diameter 18 hole 10
via -78.75,-590.55 diameter 18 hole 10
via -433.14,-1456.23 diameter 18 hole 10
via -157.5,-669.3 diameter 18 hole 10
via 511.75,-196.85 diameter 18 hole 10
via -433.14,-1101.91 diameter 18 hole 10
via 472.45,-511.75 diameter 18 hole 10
via 275.55,-314.95 diameter 18 hole 10
via 157.4,-1220.02 diameter 18 hole 10
via -118.05,-354.25 diameter 18 hole 10
via -354.4,-1298.75 diameter 18 hole 10
via 196.85,-629.85 diameter 18 hole 10
via 511.75,-669.25 diameter 18 hole 10
via -433.14,-1180.65 diameter 18 hole 10
via 157.5,-551.2 diameter 18 hole 10
via -39.45,-1062.54 diameter 18 hole 10
via -157.5,-551.2 diameter 18 hole 10
via 551.2,-551.2 diameter 18 hole 10
via 236.15,-314.95 diameter 18 hole 10
via 472.45,-354.25 diameter 18 hole 10
via -393.77,-1495.6 diameter 18 hole 10
via -275.55,-314.95 diameter 18 hole 10
via -314.95,-393.65 diameter 18 hole 10
via 39.29,-1062.54 diameter 18 hole 10
via -39.35,-629.85 diameter 18 hole 10
via 433.1,433.1 diameter 18 hole 10
via 511.75,-275.55 diameter 18 hole 10
via -0.08,-1456.23 diameter 18 hole 10
via 39.35,-354.25 diameter 18 hole 10
via 78.66,-1338.12 diameter 18 hole 10
via 393.65,-590.55 diameter 18 hole 10
via 157.4,-1062.54 diameter 18 hole 10
via -275.55,-472.45 diameter 18 hole 10
via -275.66,-1101.91 diameter 18 hole 10
via -236.15,-393.65 diameter 18 hole 10
via 275.55,-511.75 diameter 18 hole 10
via -78.82,-1062.54 diameter 18 hole 10
via -78.75,-551.15 diameter 18 hole 10
via -354.4,-1141.28 diameter 18 hole 10
via -236.15,-433.05 diameter 18 hole 10
via -39.45,-1495.6 diameter 18 hole 10
via -354.25,-472.45 diameter 18 hole 10
via 118.03,-1062.54 diameter 18 hole 10
via -157.5,-433.1 diameter 18 hole 10
via 118.03,-1377.49 diameter 18 hole 10
via 393.65,-629.85 diameter 18 hole 10
via 275.6,-433.1 diameter 18 hole 10
via -78.82,-1456.23 diameter 18 hole 10
via 78.75,-551.15 diameter 18 hole 10
via -0.08,-1141.28 diameter 18 hole 10
via -196.85,-314.95 diameter 18 hole 10
via 551.15,-236.15 diameter 18 hole 10
via 196.85,-314.95 diameter 18 hole 10
via -236.29,-1456.23 diameter 18 hole 10
via -39.4,-393.7 diameter 18 hole 10
via 39.29,-1495.6 diameter 18 hole 10
via 118.05,-354.25 diameter 18 hole 10
via 157.45,314.95 diameter 18 hole 10
via 157.4,-1180.65 diameter 18 hole 10
via 275.6,-669.3 diameter 18 hole 10
via -157.45,-629.85 diameter 18 hole 10
via -393.77,-1180.65 diameter 18 hole 10
via 236.15,-551.15 diameter 18 hole 10
via 236.15,-354.25 diameter 18 hole 10
via 393.65,-78.75 diameter 18 hole 10
via -39.45,-1141.28 diameter 18 hole 10
via 39.4,-433.1 diameter 18 hole 10
via -0.08,-1101.91 diameter 18 hole 10
via -39.4,-669.3 diameter 18 hole 10
via 472.45,-275.55 diameter 18 hole 10
via -0.08,-1495.6 diameter 18 hole 10
via -354.25,-511.75 diameter 18 hole 10
via 590.55,-236.15 diameter 18 hole 10
via 78.66,-1101.91 diameter 18 hole 10
via -157.45,-511.75 diameter 18 hole 10
via -39.35,354.25 diameter 18 hole 10
via 511.75,-39.35 diameter 18 hole 10
via -39.45,-1101.91 diameter 18 hole 10
via -157.45,-354.25 diameter 18 hole 10
via -157.5,-275.6 diameter 18 hole 10
via -354.4,-1062.54 diameter 18 hole 10
via -118.05,-629.85 diameter 18 hole 10
via 78.66,-1495.6 diameter 18 hole 10
via 39.35,-314.95 diameter 18 hole 10
via 472.45,-196.85 diameter 18 hole 10
via -196.92,-1416.86 diameter 18 hole 10
via 78.75,-511.75 diameter 18 hole 10
via -78.75,-472.45 diameter 18 hole 10
via -393.77,-1338.12 diameter 18 hole 10
via 157.5,-669.3 diameter 18 hole 10
via -0.08,-1416.86 diameter 18 hole 10
via -354.25,-629.85 diameter 18 hole 10
via -78.82,-1141.28 diameter 18 hole 10
via -196.85,-393.65 diameter 18 hole 10
via -236.29,-1062.54 diameter 18 hole 10
via -196.85,-590.55 diameter 18 hole 10
via -315.03,-1141.28 diameter 18 hole 10
via 78.75,-433.05 diameter 18 hole 10
via 157.4,-1338.12 diameter 18 hole 10
via 118.05,-472.45 diameter 18 hole 10
via -315.03,-1456.23 diameter 18 hole 10
via -275.55,-354.25 diameter 18 hole 10
via 78.66,-1220.02 diameter 18 hole 10
via 314.95,-551.15 diameter 18 hole 10
via -275.66,-1141.28 diameter 18 hole 10
via -118.05,-472.45 diameter 18 hole 10
via 39.4,-551.2 diameter 18 hole 10
via 236.15,-511.75 diameter 18 hole 10
via 118.03,-1298.75 diameter 18 hole 10
via 78.75,-314.95 diameter 18 hole 10
via -236.29,-1495.6 diameter 18 hole 10
via -393.65,-511.75 diameter 18 hole 10
via -354.4,-1338.12 diameter 18 hole 10
via 196.85,-669.25 diameter 18 hole 10
via -433.14,-1062.54 diameter 18 hole 10
via 157.4,-1377.49 diameter 18 hole 10
via 354.25,-669.25 diameter 18 hole 10
via -275.55,118.05 diameter 18 hole 10
via 118.03,-1416.86 diameter 18 hole 10
via 118.05,-551.15 diameter 18 hole 10
via 314.95,-39.35 diameter 18 hole 10
via 157.5,157.5 diameter 18 hole 10
via -393.77,-1101.91 diameter 18 hole 10
via -118.05,-590.55 diameter 18 hole 10
via 39.35,-118.05 diameter 18 hole 10
via -393.77,-1298.75 diameter 18 hole 10
via -275.6,-551.2 diameter 18 hole 10
via 39.29,-1456.23 diameter 18 hole 10
via 118.05,-629.85 diameter 18 hole 10
via -39.4,-39.4 diameter 18 hole 10
via 157.4,-1101.91 diameter 18 hole 10
via 314.95,-590.55 diameter 18 hole 10
via -393.77,-1416.86 diameter 18 hole 10
via -275.6,-669.3 diameter 18 hole 10
via -314.95,-118.05 diameter 18 hole 10
via 39.4,-39.4 diameter 18 hole 10
via -78.82,-1416.86 diameter 18 hole 10
via -314.95,-629.85 diameter 18 hole 10
via -314.95,-78.75 diameter 18 hole 10
via -39.35,629.85 diameter 18 hole 10
via -551.2,669.3 diameter 18 hole 10
via -590.55,669.25 diameter 18 hole 10
via -669.25,629.85 diameter 18 hole 10
via 39.35,314.95 diameter 18 hole 10
via 78.75,275.55 diameter 18 hole 10
via 78.75,314.95 diameter 18 hole 10
via 118.05,433.05 diameter 18 hole 10
via 196.85,-393.65 diameter 18 hole 10
via 196.85,-433.05 diameter 18 hole 10
via 236.15,-433.05 diameter 18 hole 10
via 236.15,-393.65 diameter 18 hole 10
via 196.85,-472.45 diameter 18 hole 10
via -78.75,669.25 diameter 18 hole 10
via 118.05,236.15 diameter 18 hole 10
via 314.95,-472.45 diameter 18 hole 10
via 314.95,-433.05 diameter 18 hole 10
via 196.85,-511.75 diameter 18 hole 10
via -275.6,-433.1 diameter 18 hole 10
via -393.65,-472.45 diameter 18 hole 10
via -354.25,-590.55 diameter 18 hole 10
via -275.66,-1180.65 diameter 18 hole 10
via -275.66,-1377.49 diameter 18 hole 10
via -157.5,-393.7 diameter 18 hole 10
via 275.6,-393.7 diameter 18 hole 10
via -39.35,-354.25 diameter 18 hole 10
via 118.05,-314.95 diameter 18 hole 10
via -236.15,-551.15 diameter 18 hole 10
via -118.05,-511.75 diameter 18 hole 10
via 39.35,-472.45 diameter 18 hole 10
via -196.85,-669.25 diameter 18 hole 10
via 78.75,-590.55 diameter 18 hole 10
via -78.75,-629.85 diameter 18 hole 10
via -177.3,-1012.54 diameter 18 hole 10
via 157.5,-433.1 diameter 18 hole 10
via 314.95,-511.75 diameter 18 hole 10
via 354.25,-629.85 diameter 18 hole 10
via 236.15,-669.25 diameter 18 hole 10
via 196.85,-551.15 diameter 18 hole 10
via -236.29,-1180.65 diameter 18 hole 10
via -236.29,-1377.49 diameter 18 hole 10
via -157.55,-1180.65 diameter 18 hole 10
via -78.82,-1180.65 diameter 18 hole 10
via -157.55,-1141.28 diameter 18 hole 10
via -196.92,-1180.65 diameter 18 hole 10
via -39.45,-1180.65 diameter 18 hole 10
via -0.08,-1180.65 diameter 18 hole 10
via -157.55,-1377.49 diameter 18 hole 10
via -78.82,-1377.49 diameter 18 hole 10
via -196.92,-1377.49 diameter 18 hole 10
via -157.55,-1416.86 diameter 18 hole 10
via -0.08,-1377.49 diameter 18 hole 10
via -39.45,-1377.49 diameter 18 hole 10
via -98.51,-1545.55 diameter 18 hole 10
via -78.75,354.25 diameter 18 hole 10
via 78.75,393.65 diameter 18 hole 10
via 433.1,-157.5 diameter 18 hole 10
via 393.7,-157.5 diameter 18 hole 10
via 39.4,275.6 diameter 18 hole 10
via -118.05,275.55 diameter 18 hole 10
via -157.5,275.6 diameter 18 hole 10
via 157.45,236.15 diameter 18 hole 10
via -157.45,354.25 diameter 18 hole 10
via -196.85,275.55 diameter 18 hole 10